# Altium footprint library IC.PcbLib: 386 footprints (part 16 of 30)
Each footprint in its own frame and in the unit in brackets; x right, y up, seen from the top. Pads: shape width x height; smd on the part's side, far side on the other; paste and mask are expansions set on the pad; w line width, h text height; cw(c..) or ccw(c..) is an arc to the next point about the centre after c.
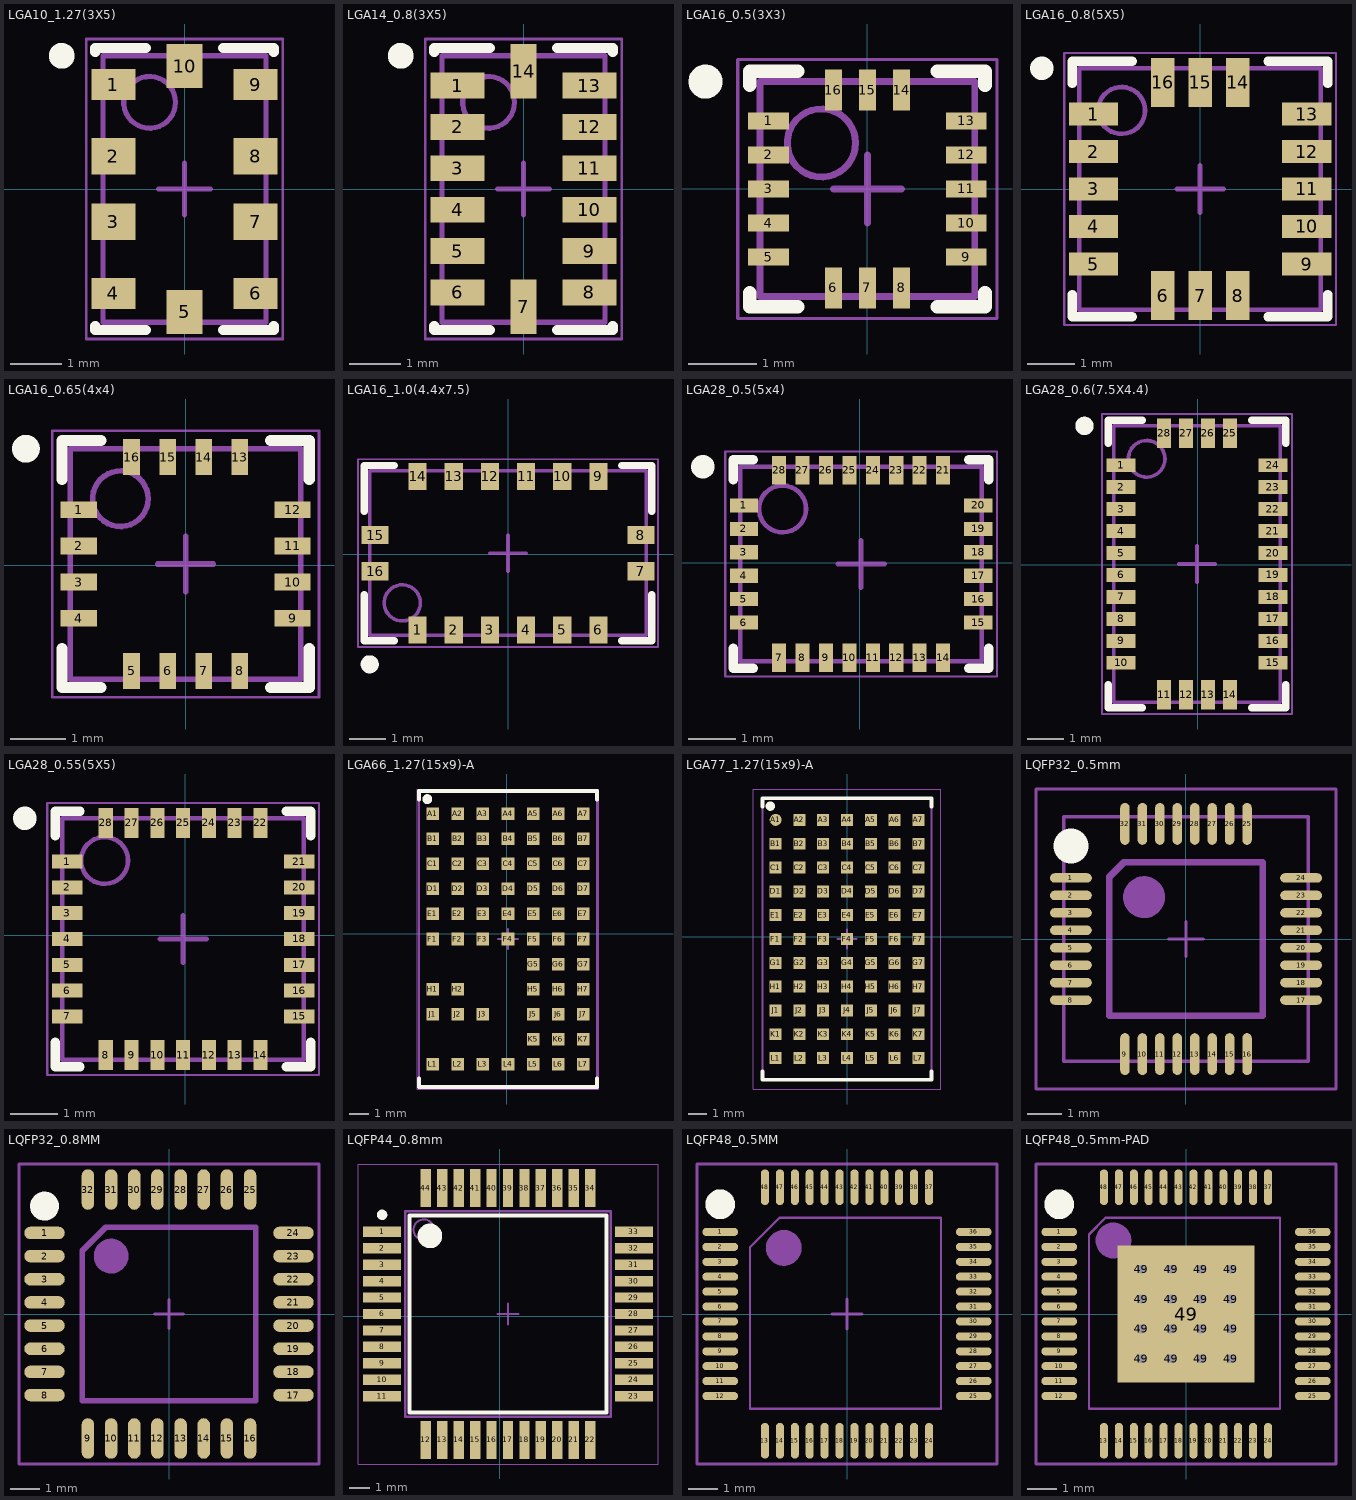
[diagram p15: the footprints below, top view; thin cyan lines are the x and y axes]

## LGA10_1.27(3X5) [mm] "PQFN, 10-Leads, Body 3x5mm, Pitch 1.27/1.382mm, IPC High Density"
height 1.1
pads (10):
  rect 0.85x0.6 smd: 1(-1.375,2.017) 4(-1.375,-2.017) 6(1.375,-2.017) 9(1.375,2.017)
  rect 0.85x0.7 smd: 2(-1.375,0.635) 3(-1.375,-0.635) 7(1.375,-0.635) 8(1.375,0.635)
  rect 0.7x0.85 smd: 5(0,-2.375) 10(0,2.375)
Top Overlay:
  circle w0.25: c-2.375,2.575 r0.125
  lines w0.2: -1.725,-2.655 -1.725,-2.725 -0.75,-2.725 ; -1.725,2.655 -1.725,2.725 -0.75,2.725 ; 0.75,-2.725 1.725,-2.725 1.725,-2.655 ; 0.75,2.725 1.725,2.725 1.725,2.655
Mechanical 13:
  circle w0.1: c-0.675,1.675 r0.5
  lines w0.1: -1.575,-2.575 -1.575,2.575 1.575,2.575 1.575,-2.575 -1.575,-2.575
Mechanical 15:
  lines w0.05: -1.9,-2.9 -1.9,2.9 1.9,2.9 1.9,-2.9 -1.9,-2.9
  lines w0.1: -0.5,0 0.5,0 ; 0,-0.5 0,0.5
3D body: height 1.15, standoff 0, extent -1.338,1.956 -0.94,2.355
3D body: height 1.1, standoff 0, extent -1.575,-2.575 1.575,2.575

## LGA14_0.8(3X5) [mm] "PQFN, 14-Leads, Body 3x5mm, Pitch 0.8mm, IPC High Density"
height 1
pads (14):
  rect 1.05x0.5 smd: 1(-1.275,2) 2(-1.275,1.2) 3(-1.275,0.4) 4(-1.275,-0.4) 5(-1.275,-1.2) 6(-1.275,-2) 8(1.275,-2) 9(1.275,-1.2) 10(1.275,-0.4) 11(1.275,0.4) 12(1.275,1.2) 13(1.275,2)
  rect 0.5x1.05 smd: 7(0,-2.275) 14(0,2.275)
Top Overlay:
  circle w0.25: c-2.375,2.575 r0.125
  lines w0.2: -1.725,-2.65 -1.725,-2.725 -0.65,-2.725 ; -1.725,2.65 -1.725,2.725 -0.65,2.725 ; 0.65,-2.725 1.725,-2.725 1.725,-2.65 ; 0.65,2.725 1.725,2.725 1.725,2.65
Mechanical 13:
  circle w0.1: c-0.675,1.675 r0.5
  lines w0.1: -1.575,-2.575 -1.575,2.575 1.575,2.575 1.575,-2.575 -1.575,-2.575
Mechanical 15:
  lines w0.05: -1.9,-2.9 -1.9,2.9 1.9,2.9 1.9,-2.9 -1.9,-2.9
  lines w0.1: -0.5,0 0.5,0 ; 0,-0.5 0,0.5
3D body: height 1, standoff 0, extent -1.575,-2.575 1.575,2.575
3D body: height 1.1, standoff 0, extent -1.367,1.934 -0.968,2.333

## LGA16_0.5(3X3) [mm] "PQFN, 16-Leads, Body 3x3mm, Pitch 0.5mm, IPC High Density"
height 1
pads (16):
  rect 0.6x0.25 smd: 1(-1.449,1) 2(-1.449,0.5) 3(-1.449,0) 4(-1.449,-0.5) 5(-1.449,-1) 9(1.449,-1) 10(1.449,-0.5) 11(1.449,0) 12(1.449,0.5) 13(1.449,1)
  rect 0.25x0.6 smd: 6(-0.5,-1.449) 7(0,-1.449) 8(0.5,-1.449) 14(0.5,1.449) 15(0,1.449) 16(-0.5,1.449)
Top Overlay:
  circle w0.25: c-2.375,1.575 r0.125
  lines w0.2: -1.725,-1.525 -1.725,-1.725 -1.025,-1.725 ; -1.725,1.525 -1.725,1.725 -1.025,1.725 ; 1.025,-1.725 1.725,-1.725 1.725,-1.525 ; 1.025,1.725 1.725,1.725 1.725,1.525
Mechanical 13:
  circle w0.1: c-0.675,0.675 r0.5
  lines w0.1: -1.575,-1.575 1.575,-1.575 1.575,1.575 -1.575,1.575 -1.575,-1.575
Mechanical 15:
  lines w0.05: -1.9,-1.9 1.9,-1.9 1.9,1.9 -1.9,1.9 -1.9,-1.9
  lines w0.1: -0.5,0 0.5,0 ; 0,-0.5 0,0.5
3D body: height 1, standoff 0, extent -1.524,-1.55 1.626,1.6
3D body: height 1.05, standoff 0.1, extent -1.367,0.994 -0.968,1.394

## LGA16_0.8(5X5) [mm] "PQFN, 16-Leads, Body 5x5mm, Pitch 0.8mm, IPC High Density"
height 1.6
pads (16):
  rect 1.05x0.5 smd: 1(-2.275,1.6) 2(-2.275,0.8) 3(-2.275,0) 4(-2.275,-0.8) 5(-2.275,-1.6) 9(2.275,-1.6) 10(2.275,-0.8) 11(2.275,0) 12(2.275,0.8) 13(2.275,1.6)
  rect 0.5x1.05 smd: 6(-0.8,-2.275) 7(0,-2.275) 8(0.8,-2.275) 14(0.8,2.275) 15(0,2.275) 16(-0.8,2.275)
Top Overlay:
  circle w0.25: c-3.375,2.575 r0.125
  lines w0.2: -2.725,-2.25 -2.725,-2.725 -1.45,-2.725 ; -2.725,2.25 -2.725,2.725 -1.45,2.725 ; 1.45,-2.725 2.725,-2.725 2.725,-2.25 ; 1.45,2.725 2.725,2.725 2.725,2.25
Mechanical 13:
  circle w0.1: c-1.675,1.675 r0.5
  lines w0.1: -2.575,-2.575 -2.575,2.575 2.575,2.575 2.575,-2.575 -2.575,-2.575
Mechanical 15:
  lines w0.05: -2.9,-2.9 -2.9,2.9 2.9,2.9 2.9,-2.9 -2.9,-2.9
  lines w0.1: -0.5,0 0.5,0 ; 0,-0.5 0,0.5
3D body: height 1.6, standoff 0, extent -2.575,-2.575 2.575,2.575

## LGA16_0.65(4x4) [mm]
pads (16):
  rect 0.65x0.3 smd: 1(-1.924,1) 2(-1.924,0.35) 3(-1.924,-0.3) 4(-1.924,-0.95) 9(1.924,-0.95) 10(1.924,-0.3) 11(1.924,0.35) 12(1.924,1)
  rect 0.3x0.65 smd: 5(-0.975,-1.899) 6(-0.325,-1.899) 7(0.325,-1.899) 8(0.975,-1.899) 13(0.975,1.95) 14(0.325,1.95) 15(-0.325,1.95) 16(-0.975,1.95)
Top Overlay:
  circle w0.25: c-2.875,2.1 r0.125
  lines w0.2: -2.225,-1.5 -2.225,-2.2 -1.525,-2.2 ; -2.225,1.55 -2.225,2.25 -1.525,2.25 ; 1.525,-2.2 2.225,-2.2 2.225,-1.5 ; 1.525,2.25 2.225,2.25 2.225,1.55
Mechanical 13:
  circle w0.1: c-1.175,1.2 r0.5
  lines w0.1: -2.075,-2.05 2.075,-2.05 2.075,2.1 -2.075,2.1 -2.075,-2.05
Mechanical 15:
  lines w0.05: -2.4,-2.375 2.4,-2.375 2.4,2.425 -2.4,2.425 -2.4,-2.375
  lines w0.1: -0.5,0.025 0.5,0.025 ; 0,-0.475 0,0.525
3D body "User Library-LGA-16.step": height 0.98, standoff 0, extent -2,-2 2,2

## LGA16_1.0(4.4x7.5) [mm]
pads (16):
  rect 0.5x0.75 smd: 1(-2.5,-2.1) 2(-1.5,-2.1) 3(-0.5,-2.1) 4(0.5,-2.1) 5(1.5,-2.1) 6(2.5,-2.1) 9(2.5,2.15) 10(1.5,2.15) 11(0.5,2.15) 12(-0.5,2.15) 13(-1.5,2.15) 14(-2.5,2.15)
  rect 0.75x0.5 smd: 7(3.675,-0.475) 8(3.675,0.525) 15(-3.675,0.525) 16(-3.675,-0.475)
Top Overlay:
  circle w0.25: c-3.825,-3.05 r0.125
  lines w0.2: -3.975,-1.125 -3.975,-2.4 -3.15,-2.4 ; -3.975,1.175 -3.975,2.45 -3.15,2.45 ; 3.15,-2.4 3.975,-2.4 3.975,-1.125 ; 3.15,2.45 3.975,2.45 3.975,1.175
Mechanical 13:
  circle w0.1: c-2.925,-1.35 r0.5
  lines w0.1: -3.825,-2.25 -3.825,2.3 3.825,2.3 3.825,-2.25 -3.825,-2.25
Mechanical 15:
  lines w0.05: -4.15,-2.575 -4.15,2.625 4.15,2.625 4.15,-2.575 -4.15,-2.575
  lines w0.1: -0.5,0.025 0.5,0.025 ; 0,-0.475 0,0.525
3D body: height 1, standoff 0, extent -3.825,-2.25 3.825,2.3
3D body: height 1.1, standoff 0, extent -3.373,-1.978 -2.975,-1.578

## LGA28_0.5(5x4) [mm]
pads (28):
  rect 0.6x0.3 smd: 1(-2.475,1.225) 2(-2.475,0.725) 3(-2.475,0.225) 4(-2.475,-0.275) 5(-2.475,-0.775) 6(-2.475,-1.275) 15(2.525,-1.275) 16(2.525,-0.775) 17(2.525,-0.275) 18(2.525,0.225) 19(2.525,0.725) 20(2.525,1.225)
  rect 0.3x0.6 smd: 7(-1.725,-2.025) 8(-1.225,-2.025) 9(-0.725,-2.025) 10(-0.225,-2.025) 11(0.275,-2.025) 12(0.775,-2.025) 13(1.275,-2.025) 14(1.775,-2.025) 21(1.775,1.975) 22(1.275,1.975) 23(0.775,1.975) 24(0.275,1.975) 25(-0.225,1.975) 26(-0.725,1.975) 27(-1.225,1.975) 28(-1.725,1.975)
Top Overlay:
  circle w0.25: c-3.35,2.05 r0.125
  lines w0.2: -2.7,-1.825 -2.7,-2.25 -2.275,-2.25 ; -2.7,1.775 -2.7,2.2 -2.275,2.2 ; 2.325,-2.25 2.75,-2.25 2.75,-1.825 ; 2.325,2.2 2.75,2.2 2.75,1.775
Mechanical 13:
  circle w0.1: c-1.65,1.15 r0.5
  lines w0.1: -2.55,-2.1 2.6,-2.1 2.6,2.05 -2.55,2.05 -2.55,-2.1
Mechanical 15:
  lines w0.05: -2.875,-2.425 2.925,-2.425 2.925,2.375 -2.875,2.375 -2.875,-2.425
  lines w0.1: -0.475,-0.025 0.525,-0.025 ; 0.025,-0.525 0.025,0.475
3D body: height 1.1, standoff 0, extent -2.383,1.172 -1.984,1.571
3D body "User Library-LGA28.step": height 1.12, standoff 0, extent -2.475,-2.044 2.525,1.956

## LGA28_0.6(7.5X4.4) [mm]
pads (28):
  rect 0.8x0.38 smd: 1(-2.1,2.725) 2(-2.1,2.125) 3(-2.1,1.525) 4(-2.1,0.925) 5(-2.1,0.325) 6(-2.1,-0.275) 7(-2.1,-0.875) 8(-2.1,-1.475) 9(-2.1,-2.075) 10(-2.1,-2.675) 15(2.05,-2.675) 16(2.05,-2.075) 17(2.05,-1.475) 18(2.05,-0.875) 19(2.05,-0.275) 20(2.05,0.325) 21(2.05,0.925) 22(2.05,1.525) 23(2.05,2.125) 24(2.05,2.725)
  rect 0.38x0.8 smd: 11(-0.925,-3.55) 12(-0.325,-3.55) 13(0.275,-3.55) 14(0.875,-3.55) 25(0.875,3.6) 26(0.275,3.6) 27(-0.325,3.6) 28(-0.925,3.6)
Top Overlay:
  circle w0.25: c-3.1,3.8 r0.125
  lines w0.2: -2.45,-3.275 -2.45,-3.9 -1.525,-3.9 ; -2.45,3.325 -2.45,3.95 -1.525,3.95 ; 1.475,-3.9 2.4,-3.9 2.4,-3.275 ; 1.475,3.95 2.4,3.95 2.4,3.325
Mechanical 13:
  circle w0.1: c-1.4,2.9 r0.5
  lines w0.1: -2.3,-3.75 -2.3,3.8 2.25,3.8 2.25,-3.75 -2.3,-3.75
Mechanical 15:
  lines w0.05: -2.625,-4.075 -2.625,4.125 2.575,4.125 2.575,-4.075 -2.625,-4.075
  lines w0.1: -0.525,0.025 0.475,0.025 ; -0.025,-0.475 -0.025,0.525
3D body: height 1.2, standoff 0, extent -2.052,3.179 -1.654,3.578
3D body: height 1.1, standoff 0, extent -2.3,-3.75 2.25,3.8

## LGA28_0.55(5X5) [mm]
pads (28):
  rect 0.65x0.3 smd: 1(-2.526,1.574) 2(-2.526,1.024) 3(-2.526,0.474) 4(-2.526,-0.076) 5(-2.526,-0.626) 6(-2.526,-1.176) 7(-2.526,-1.726) 15(2.424,-1.726) 16(2.424,-1.176) 17(2.424,-0.626) 18(2.424,-0.076) 19(2.424,0.474) 20(2.424,1.024) 21(2.424,1.574)
  rect 0.3x0.65 smd: 8(-1.701,-2.551) 9(-1.151,-2.551) 10(-0.601,-2.551) 11(-0.051,-2.551) 12(0.499,-2.551) 13(1.049,-2.551) 14(1.599,-2.551) 22(1.599,2.399) 23(1.049,2.399) 24(0.499,2.399) 25(-0.051,2.399) 26(-0.601,2.399) 27(-1.151,2.399) 28(-1.701,2.399)
Top Overlay:
  circle w0.25: c-3.426,2.499 r0.125
  lines w0.2: -2.776,-2.276 -2.776,-2.801 -2.251,-2.801 ; -2.776,2.124 -2.776,2.649 -2.251,2.649 ; 2.149,-2.801 2.674,-2.801 2.674,-2.276 ; 2.149,2.649 2.674,2.649 2.674,2.124
Mechanical 13:
  circle w0.1: c-1.726,1.599 r0.5
  lines w0.1: -2.626,-2.651 2.524,-2.651 2.524,2.499 -2.626,2.499 -2.626,-2.651
Mechanical 15:
  lines w0.05: -2.951,-2.976 2.849,-2.976 2.849,2.824 -2.951,2.824 -2.951,-2.976
  lines w0.1: -0.551,-0.076 0.449,-0.076 ; -0.051,-0.576 -0.051,0.424
3D body: height 1.1, standoff 0, extent -2.357,1.807 -1.959,2.206
3D body: height 1, standoff 0, extent -2.626,-2.651 2.524,2.499

## LGA66_1.27(15x9)-A [mil]
pads (66):
  rect 25x25 smd: A1(-148,240) A2(-98,240) A3(-48,240) A4(2,240) A5(52,240) A6(102,240) A7(152,240) B1(-148,190) B2(-98,190) B3(-48,190) B4(2,190) B5(52,190) B6(102,190) B7(152,190) C1(-148,140) C2(-98,140) C3(-48,140) C4(2,140) C5(52,140) C6(102,140) C7(152,140) D1(-148,90) D2(-98,90) D3(-48,90) D4(2,90) D5(52,90) D6(102,90) D7(152,90) E1(-148,40) E2(-98,40) E3(-48,40) E4(2,40) E5(52,40) E6(102,40) E7(152,40) F1(-148,-10) F2(-98,-10) F3(-48,-10) F4(2,-10) F5(52,-10) F6(102,-10) F7(152,-10) G5(52,-60) G6(102,-60) G7(152,-60) H1(-148,-110) H2(-98,-110) H5(52,-110) H6(102,-110) H7(152,-110) J1(-148,-160) J2(-98,-160) J3(-48,-160) J5(52,-160) J6(102,-160) J7(152,-160) K5(52,-210) K6(102,-210) K7(152,-210) L1(-148,-260) L2(-98,-260) L3(-48,-260) L4(2,-260) L5(52,-260) L6(102,-260) L7(152,-260)
Top Overlay:
  circle w9.84: c-159,269 r4.92
  lines w7.87: -175.17,-288.27 -175.17,-305.28 179.17,-305.28 179.17,-288.27 ; -175.17,268.27 -175.17,285.28 179.17,285.28 179.17,268.27
Mechanical 13:
  lines w3.94: -175.17,-305.28 -175.17,285.28 179.17,285.28 179.17,-305.28 -175.17,-305.28
Mechanical 15:
  lines w1.97: -179.1,-309.21 -179.1,289.21 183.1,289.21 183.1,-309.21 -179.1,-309.21
  lines w3.94: -17.68,-10 21.68,-10 ; 2,-29.68 2,9.69
3D body: height 174.02, standoff 0, extent -175.17,-305.28 179.17,285.28
3D body: height 174.41, standoff 0, extent -160.52,227.36 -121.31,266.65

## LGA77_1.27(15x9)-A [mil]
pads (77):
  round 25 smd: A1(-150,245)
  rect 25x25 smd: A2(-100,245) A3(-50,245) A4(0,245) A5(50,245) A6(100,245) A7(150,245) B1(-150,195) B2(-100,195) B3(-50,195) B4(0,195) B5(50,195) B6(100,195) B7(150,195) C1(-150,145) C2(-100,145) C3(-50,145) C4(0,145) C5(50,145) C6(100,145) C7(150,145) D1(-150,95) D2(-100,95) D3(-50,95) D4(0,95) D5(50,95) D6(100,95) D7(150,95) E1(-150,45) E2(-100,45) E3(-50,45) E4(0,45) E5(50,45) E6(100,45) E7(150,45) F1(-150,-5) F2(-100,-5) F3(-50,-5) F4(0,-5) F5(50,-5) F6(100,-5) F7(150,-5) G1(-150,-55) G2(-100,-55) G3(-50,-55) G4(0,-55) G5(50,-55) G6(100,-55) G7(150,-55) H1(-150,-105) H2(-100,-105) H3(-50,-105) H4(0,-105) H5(50,-105) H6(100,-105) H7(150,-105) J1(-150,-155) J2(-100,-155) J3(-50,-155) J4(0,-155) J5(50,-155) J6(100,-155) J7(150,-155) K1(-150,-205) K2(-100,-205) K3(-50,-205) K4(0,-205) K5(50,-205) K6(100,-205) K7(150,-205) L1(-150,-255) L2(-100,-255) L3(-50,-255) L4(0,-255) L5(50,-255) L6(100,-255) L7(150,-255)
Top Overlay:
  circle w9.84: c-161,274 r4.92
  lines w7.87: -177.17,-283.27 -177.17,-300.28 177.17,-300.28 177.17,-283.27 ; -177.17,273.27 -177.17,290.28 177.17,290.28 177.17,273.27
Mechanical 13:
  lines w3.94: -177.17,-300.28 -177.17,290.28 177.17,290.28 177.17,-300.28 -177.17,-300.28
Mechanical 15:
  lines w1.97: -196.85,-319.96 -196.85,309.96 196.85,309.96 196.85,-319.96 -196.85,-319.96
  lines w3.94: -19.68,-5 19.68,-5 ; 0,-24.68 0,14.69
3D body: height 114.96, standoff 0, extent -177.17,-300.28 177.17,290.28
3D body: height 115.35, standoff 0, extent -157.52,227.36 -118.31,266.65

## LQFP32_0.5mm [mm]
height 1.05
pads (32):
  oval 1.2x0.27 smd: 1(-3.3,1.75) 2(-3.3,1.25) 3(-3.3,0.75) 4(-3.3,0.25) 5(-3.3,-0.25) 6(-3.3,-0.75) 7(-3.3,-1.25) 8(-3.3,-1.75) 17(3.3,-1.75) 18(3.3,-1.25) 19(3.3,-0.75) 20(3.3,-0.25) 21(3.3,0.25) 22(3.3,0.75) 23(3.3,1.25) 24(3.3,1.75)
  oval 0.27x1.2 smd: 9(-1.75,-3.3) 10(-1.25,-3.3) 11(-0.75,-3.3) 12(-0.25,-3.3) 13(0.25,-3.3) 14(0.75,-3.3) 15(1.25,-3.3) 16(1.75,-3.3) 25(1.75,3.3) 26(1.25,3.3) 27(0.75,3.3) 28(0.25,3.3) 29(-0.25,3.3) 30(-0.75,3.3) 31(-1.25,3.3) 32(-1.75,3.3)
Top Overlay:
  lines w1: -3.3,2.668 -3.3,2.667
Mechanical 15:
  circle w0.6: c-1.2,1.2 r0.3
  lines w0.1: -0.5,0 0.5,0 ; 0,-0.5 0,0.5 ; -4.3,-4.3 4.3,-4.3 4.3,4.3 -4.3,4.3 -4.3,-4.3 ; -3.505,-3.505 3.505,-3.505 3.505,3.505 -3.505,3.505 -3.505,-3.505
  lines w0.178: -2.2,1.778 -1.778,2.2
  lines w0.2: -2.2,-2.2 2.2,-2.2 2.2,2.2 -1.778,2.2 -2.2,1.778 -2.2,-2.2
3D body "TQFP32-0.5.STEP": height 1.2, standoff -0.03, extent -3.5,-3.5 3.5,3.5

## LQFP32_0.8MM [mm] "TQFP, 32-Leads, Body 9.2x9.2mm (max), Pitch 0.80mm, IPC Medium Density"
height 1.6
pads (32):
  oval 1.4x0.43 smd: 1(-4.3,2.8) 2(-4.3,2) 3(-4.3,1.2) 4(-4.3,0.4) 5(-4.3,-0.4) 6(-4.3,-1.2) 7(-4.3,-2) 8(-4.3,-2.8) 17(4.3,-2.8) 18(4.3,-2) 19(4.3,-1.2) 20(4.3,-0.4) 21(4.3,0.4) 22(4.3,1.2) 23(4.3,2) 24(4.3,2.8)
  oval 0.43x1.4 smd: 9(-2.8,-4.3) 10(-2,-4.3) 11(-1.2,-4.3) 12(-0.4,-4.3) 13(0.4,-4.3) 14(1.2,-4.3) 15(2,-4.3) 16(2.8,-4.3) 25(2.8,4.3) 26(2,4.3) 27(1.2,4.3) 28(0.4,4.3) 29(-0.4,4.3) 30(-1.2,4.3) 31(-2,4.3) 32(-2.8,4.3)
Top Overlay:
  circle w0.5: c-4.3,3.728 r0.25
Mechanical 15:
  circle w0.6: c-2,2 r0.3
  lines w0.1: -0.5,0 0.5,0 ; 0,-0.5 0,0.5 ; -5.182,-5.182 5.182,-5.182 5.182,5.182 -5.182,5.182 -5.182,-5.182
  lines w0.2: -3,-3 -3,2.187 -2.187,3 3,3 3,-3 -3,-3
3D body "LQFP32-0.8mm.STEP": height 1.63, standoff -0.09, extent -4.5,-4.5 4.5,4.5

## LQFP44_0.8mm [mm]
height 2.1
pads (44):
  rect 1.85x0.5 smd: 1(-5.719,4.102) 2(-5.719,3.302) 3(-5.719,2.502) 4(-5.719,1.702) 5(-5.719,0.902) 6(-5.719,0.102) 7(-5.719,-0.698) 8(-5.719,-1.498) 9(-5.719,-2.298) 10(-5.719,-3.098) 11(-5.719,-3.898) 23(6.531,-3.898) 24(6.531,-3.098) 25(6.531,-2.298) 26(6.531,-1.498) 27(6.531,-0.698) 28(6.531,0.102) 29(6.531,0.902) 30(6.531,1.702) 31(6.531,2.502) 32(6.531,3.302) 33(6.531,4.102)
  rect 0.5x1.85 smd: 12(-3.594,-6.023) 13(-2.794,-6.023) 14(-1.994,-6.023) 15(-1.194,-6.023) 16(-0.394,-6.023) 17(0.406,-6.023) 18(1.206,-6.023) 19(2.006,-6.023) 20(2.806,-6.023) 21(3.606,-6.023) 22(4.406,-6.023) 34(4.406,6.227) 35(3.606,6.227) 36(2.806,6.227) 37(2.006,6.227) 38(1.206,6.227) 39(0.406,6.227) 40(-0.394,6.227) 41(-1.194,6.227) 42(-1.994,6.227) 43(-2.794,6.227) 44(-3.594,6.227)
Top Overlay:
  circle w0.25: c-5.719,4.927 r0.125
  circle w0.6: c-3.394,3.902 r0.3
  lines w0.2: -4.394,-4.698 -4.394,4.902 5.206,4.902 5.206,-4.698 -4.394,-4.698
Mechanical 13:
  circle w0.1: c-3.694,4.202 r0.5
  lines w0.1: -4.594,-4.898 -4.594,5.102 5.406,5.102 5.406,-4.898 -4.594,-4.898
Mechanical 15:
  lines w0.05: -6.894,-7.198 -6.894,7.402 7.706,7.402 7.706,-7.198 -6.894,-7.198
  lines w0.1: -0.094,0.102 0.906,0.102 ; 0.406,-0.398 0.406,0.602
3D body "LQFP44-0.8mm.STEP": height 1.5, standoff 0.02, extent -5.568,-5.924 6.432,6.076

## LQFP48_0.5MM [mm]
pads (48):
  oval 1.2x0.27 smd: 1(-4.25,2.75) 2(-4.25,2.25) 3(-4.25,1.75) 4(-4.25,1.25) 5(-4.25,0.75) 6(-4.25,0.25) 7(-4.25,-0.25) 8(-4.25,-0.75) 9(-4.25,-1.25) 10(-4.25,-1.75) 11(-4.25,-2.25) 12(-4.25,-2.75) 25(4.25,-2.75) 26(4.25,-2.25) 27(4.25,-1.75) 28(4.25,-1.25) 29(4.25,-0.75) 30(4.25,-0.25) 31(4.25,0.25) 32(4.25,0.75) 33(4.25,1.25) 34(4.25,1.75) 35(4.25,2.25) 36(4.25,2.75)
  oval 0.27x1.2 smd: 13(-2.75,-4.25) 14(-2.25,-4.25) 15(-1.75,-4.25) 16(-1.25,-4.25) 17(-0.75,-4.25) 18(-0.25,-4.25) 19(0.25,-4.25) 20(0.75,-4.25) 21(1.25,-4.25) 22(1.75,-4.25) 23(2.25,-4.25) 24(2.75,-4.25) 37(2.75,4.25) 38(2.25,4.25) 39(1.75,4.25) 40(1.25,4.25) 41(0.75,4.25) 42(0.25,4.25) 43(-0.25,4.25) 44(-0.75,4.25) 45(-1.25,4.25) 46(-1.75,4.25) 47(-2.25,4.25) 48(-2.75,4.25)
Top Overlay:
  circle w0.5: c-4.25,3.678 r0.25
Mechanical 15:
  circle w0.6: c-2.119,2.216 r0.3
  lines w0.076: -3.251,-3.175 -3.251,2.235 -2.261,3.226 3.15,3.226 3.15,-3.175 -3.251,-3.175
  lines w0.1: -0.5,0 0.5,0 ; 0,-0.5 0,0.5 ; -5.029,-5.029 5.029,-5.029 5.029,5.029 -5.029,5.029 -5.029,-5.029
3D body "lqfp48.stp": height 1.5, standoff 0, extent -4.5,-4.489 4.5,4.511

## LQFP48_0.5mm-PAD [mm]
height 1.6
pads (65):
  oval 1.2x0.27 smd: 1(-4.25,2.75) 2(-4.25,2.25) 3(-4.25,1.75) 4(-4.25,1.25) 5(-4.25,0.75) 6(-4.25,0.25) 7(-4.25,-0.25) 8(-4.25,-0.75) 9(-4.25,-1.25) 10(-4.25,-1.75) 11(-4.25,-2.25) 12(-4.25,-2.75) 25(4.25,-2.75) 26(4.25,-2.25) 27(4.25,-1.75) 28(4.25,-1.25) 29(4.25,-0.75) 30(4.25,-0.25) 31(4.25,0.25) 32(4.25,0.75) 33(4.25,1.25) 34(4.25,1.75) 35(4.25,2.25) 36(4.25,2.75)
  oval 0.27x1.2 smd: 13(-2.75,-4.25) 14(-2.25,-4.25) 15(-1.75,-4.25) 16(-1.25,-4.25) 17(-0.75,-4.25) 18(-0.25,-4.25) 19(0.25,-4.25) 20(0.75,-4.25) 21(1.25,-4.25) 22(1.75,-4.25) 23(2.25,-4.25) 24(2.75,-4.25) 37(2.75,4.25) 38(2.25,4.25) 39(1.75,4.25) 40(1.25,4.25) 41(0.75,4.25) 42(0.25,4.25) 43(-0.25,4.25) 44(-0.75,4.25) 45(-1.25,4.25) 46(-1.75,4.25) 47(-2.25,4.25) 48(-2.75,4.25)
  round 0.6 hole 0.3: 49(-1.5,-1.5) 49(-1.5,-0.5) 49(-1.5,0.5) 49(-1.5,1.5) 49(-0.5,-1.5) 49(-0.5,-0.5) 49(-0.5,0.5) 49(-0.5,1.5) 49(0.5,-1.5) 49(0.5,-0.5) 49(0.5,0.5) 49(0.5,1.5) 49(1.5,-1.5) 49(1.5,-0.5) 49(1.5,0.5) 49(1.5,1.5)
  rect 4.6x4.6 smd paste-3: 49(0,0)
Top Overlay:
  circle w0.5: c-4.25,3.678 r0.25
Top Paste:
  region: -1.025,-0.725 -1.025,0.725 -2.235,0.725 -2.235,-0.725
  region: -1.025,1.025 -1.025,2.21 -2.21,2.21 -2.21,1.025
  region: -2.21,-1.025 -2.21,-2.21 -1.025,-2.21 -1.025,-1.025
  region: 1.025,-1.025 1.025,-2.21 2.21,-2.21 2.21,-1.025
  region: 2.21,1.025 2.21,2.21 1.025,2.21 1.025,1.025
  region: 2.235,-0.725 2.235,0.725 1.025,0.725 1.025,-0.725
  rectangle: -0.725,-2.21 0.725,-1.025
  rectangle: -0.725,1.025 0.725,2.21
  rectangle: -0.725,-0.725 0.725,0.725
Mechanical 15:
  circle w0.6: c-2.435,2.463 r0.3
  lines w0.076: -3.251,-3.175 3.15,-3.175 3.15,3.226 -2.695,3.226 -3.251,2.67 -3.251,-3.175
  lines w0.1: -0.5,0 0.5,0 ; 0,-0.5 0,0.5 ; -5.029,-5.029 -5.029,5.029 5.029,5.029 5.029,-5.029 -5.029,-5.029
3D body "LQFP48_Grid_0.5(SOT313-2).STEP": height 1.6, standoff 0, extent -4.504,-4.5 4.496,4.5